# Altium footprint library Connectors.PcbLib: 79 footprints (part 1 of 5)
Each footprint in its own frame and in the unit in brackets; x right, y up, seen from the top. Pads: shape width x height; smd on the part's side, far side on the other; paste and mask are expansions set on the pad; w line width, h text height; cw(c..) or ccw(c..) is an arc to the next point about the centre after c.
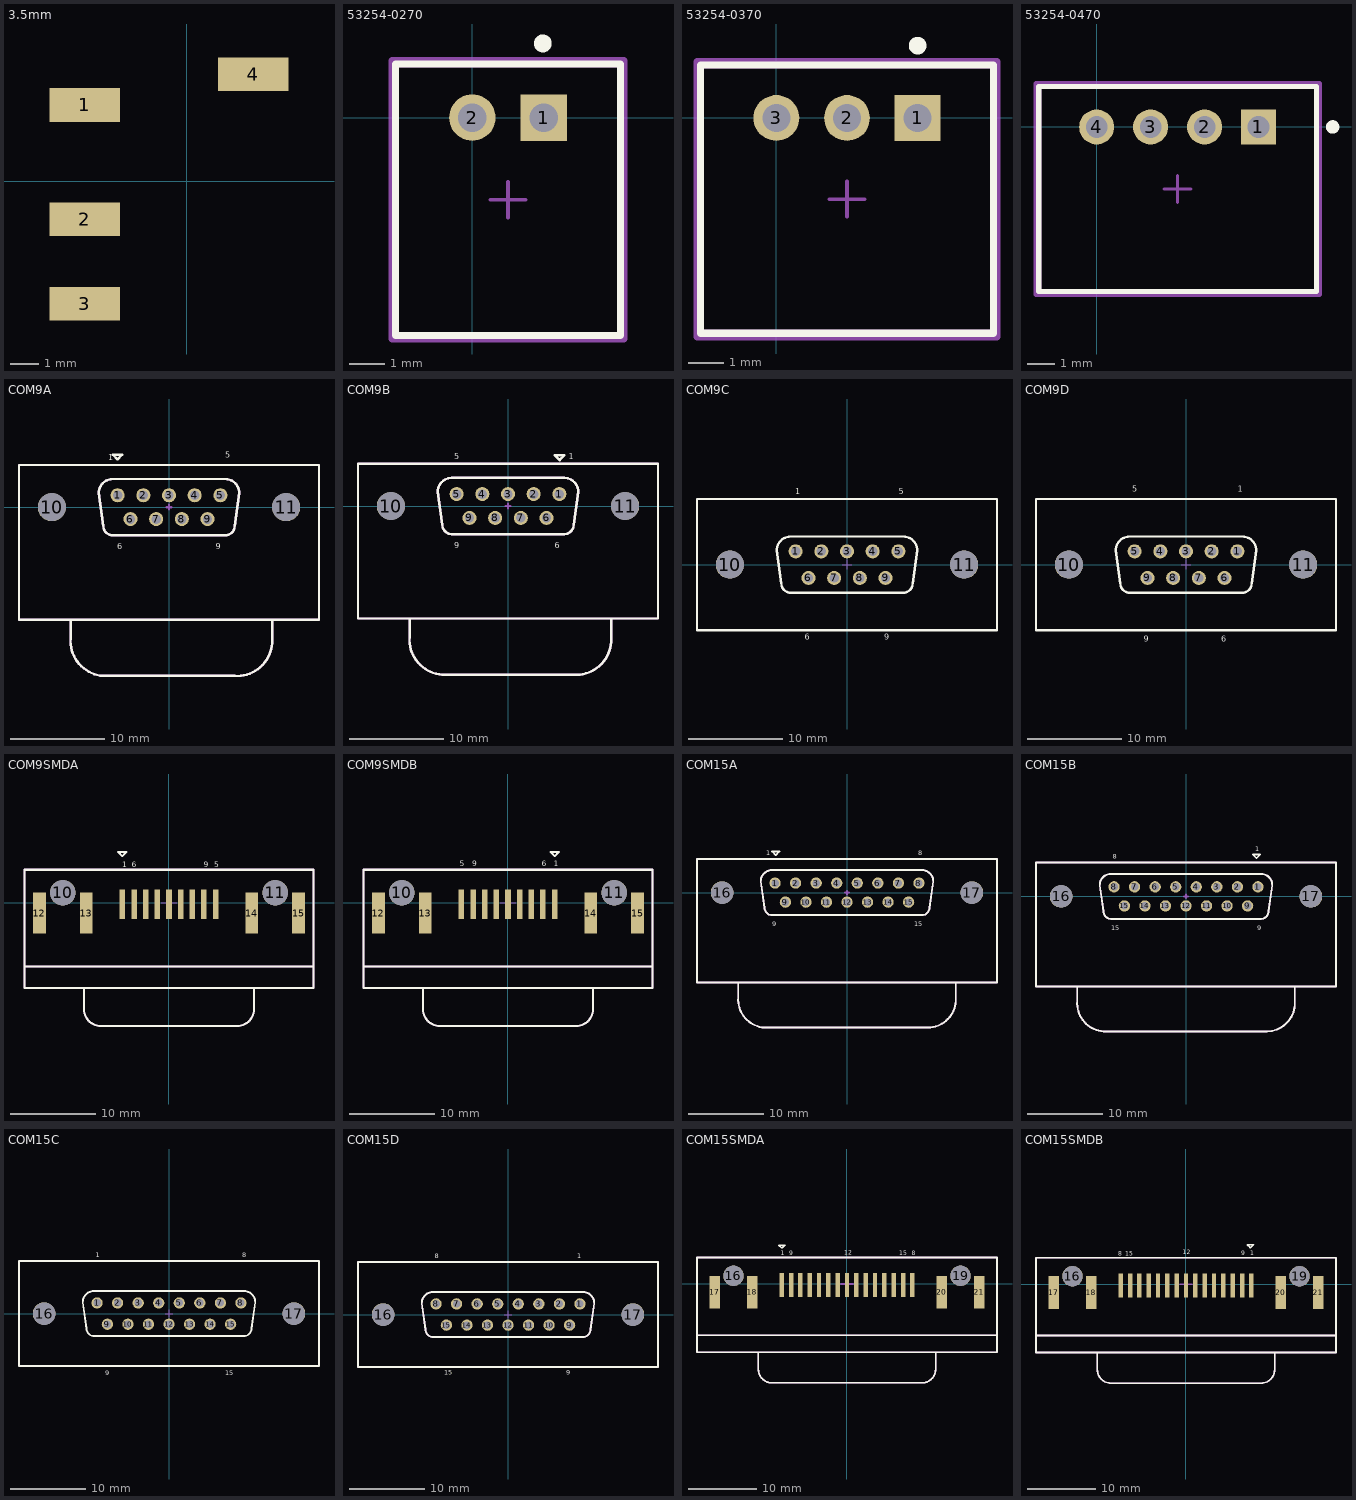
[diagram p0: the footprints below, top view; thin cyan lines are the x and y axes]

## 3.5mm [mm]
pads (4):
  rect 2.5x1.2 smd: 1(-3.627,2.71) 2(-3.627,-1.36) 3(-3.627,-4.374) 4(2.38,3.81)

## 53254-0270 [mm] "CONN HEADER R/A 2POS 2MM"
pads (2):
  rect 1.3x1.3 hole 0.8 paste-2539.97 mask+0: 1(2,0)
  round 1.3 hole 0.8 paste-2539.97 mask+0: 2(0,0)
Top Overlay:
  circle w0.25: c1.975,2.075 r0.125
  lines w0.2: -2.15,-6.1 -2.15,1.5 4.15,1.5 4.15,-6.1 -2.15,-6.1
Top Courtyard:
  lines w0.2: -2.25,-6.2 -2.25,1.6 4.25,1.6 4.25,-6.2 -2.25,-6.2
Top 3D Body:
  lines w0.2: -2.15,-6.1 -2.15,1.5 4.15,1.5 4.15,-6.1 -2.15,-6.1
Top Assembly:
  lines w0.2: -2.25,-6.2 -2.25,1.6 4.25,1.6 4.25,-6.2 -2.25,-6.2
  text ".Designator" at 1,-2.488 h1
Top Component Center:
  lines w0.1: 0.5,-2.3 1.5,-2.3 ; 1,-2.8 1,-1.8
3D body "Conn_Molex_53254-0270_eec.STEP": height 0.25, standoff 0, extent -2.25,-6.2 4.25,1.6

## 53254-0370 [mm] "CONN HEADER R/A 3POS 2MM"
pads (3):
  rect 1.3x1.3 hole 0.8 paste-2539.97 mask+0: 1(4,0)
  round 1.3 hole 0.8 paste-2539.97 mask+0: 2(2,0) 3(0,0)
Top Overlay:
  circle w0.25: c4,2.05 r0.125
  lines w0.2: -2.15,-6.1 6.15,-6.1 6.15,1.5 -2.15,1.5 -2.15,-6.1
Top Courtyard:
  lines w0.2: -2.25,-6.2 6.25,-6.2 6.25,1.6 -2.25,1.6 -2.25,-6.2
Top 3D Body:
  lines w0.2: -2.15,-6.1 6.15,-6.1 6.15,1.5 -2.15,1.5 -2.15,-6.1
Top Assembly:
  lines w0.2: -2.25,-6.2 6.25,-6.2 6.25,1.6 -2.25,1.6 -2.25,-6.2
  text ".Designator" at 2,-2.3 h1
Top Component Center:
  lines w0.1: 1.5,-2.3 2.5,-2.3 ; 2,-2.8 2,-1.8
3D body "Conn_Molex_53254-0370_eec.STEP": height 0.25, standoff 0, extent -2.25,-6.2 6.25,1.6

## 53254-0470 [mm] "CONN HEADER R/A 4POS 2MM"
pads (4):
  rect 1.3x1.3 hole 0.8 paste-2539.97 mask+0: 1(6,0)
  round 1.3 hole 0.8 paste-2539.97 mask+0: 2(4,0) 3(2,0) 4(0,0)
Top Overlay:
  circle w0.25: c8.75,0 r0.125
  lines w0.2: -2.15,-6.1 -2.15,1.5 8.15,1.5 8.15,-6.1 -2.15,-6.1
Top Courtyard:
  lines w0.2: -2.25,-6.2 -2.25,1.6 8.25,1.6 8.25,-6.2 -2.25,-6.2
Top 3D Body:
  lines w0.2: -2.15,-6.1 -2.15,1.5 8.15,1.5 8.15,-6.1 -2.15,-6.1
Top Assembly:
  lines w0.2: -2.25,-6.2 -2.25,1.6 8.25,1.6 8.25,-6.2 -2.25,-6.2
  text ".Designator" at 3,-2.112 h1
Top Component Center:
  lines w0.1: 2.5,-2.3 3.5,-2.3 ; 3,-2.8 3,-1.8
3D body "Conn_Molex_53254-0470_eec.STEP": height 0.25, standoff 0, extent -2.25,-6.2 8.25,1.6

## COM9A [mm] "D-SUB- 9P, MALE, RT ANGLE, TH"
height 12
pads (11):
  round 1.5 hole 1 unplated: 1(-5.48,1.27) 2(-2.74,1.27) 3(0,1.27) 4(2.74,1.27) 5(5.48,1.27) 6(-4.11,-1.27) 7(-1.37,-1.27) 8(1.37,-1.27) 9(4.11,-1.27)
  round 3 hole 3 unplated: 10(-12.5,0) 11(12.5,0)
Top Overlay:
  lines w0.254: -10.5,-12 -10.5,-14 ccw(c-6.75,-14.25) -7,-18 7,-18 ccw(c7.25,-14.25) 11,-14.5 11,-12 ; -5.996,-3.004 cw(c-5.996,-2) -7,-2 -7.5,1.5 cw(c-6,1.5) -6,3 6,3 cw(c6,1.5) 7.5,1.5 7,-2 cw(c5.996,-2) 5.996,-3.004 ; -5.996,-3 6,-3 ; -5.5,5.1 -6,5.6 -5,5.6 -5.5,5.1 ; -5.5,5.1 -5.5,5.1 ; -16,-12 -16,0 -16,4.5 16,4.5 16,-12 -16,-12
  text "6" at -5.5,-4.5 h0.64
  text "9" at 5,-4.5 h0.64
  text "5" at 6,5.25 h0.64
  text "1" at -6.5,5 h0.64
Mechanical 15:
  lines w0.254: -10.5,-12 -10.5,-14 ccw(c-6.75,-14.25) -7,-18 7,-18 ccw(c7.25,-14.25) 11,-14.5 11,-12 ; -5.996,-3.004 cw(c-5.996,-2) -7,-2 -7.5,1.5 cw(c-6,1.5) -6,3 6,3 cw(c6,1.5) 7.5,1.5 7,-2 cw(c5.996,-2) 5.996,-3.004 ; -5.996,-3 6,-3 ; -0.25,0 0.25,0 ; 0,-0.25 0,0.25 ; -16,-12 16,-12 16,4.5 -16,4.5 -16,0 -16,-12
3D body "210112043.stp": height 13.2, standoff -3.6, extent -15.4,-17.5 15.4,4.2

## COM9B [mm] "D-SUB- 9P, FEMALE, RT ANGLE, TH"
height 12
pads (11):
  round 1.5 hole 1 unplated: 1(5.48,1.27) 2(2.74,1.27) 3(0,1.27) 4(-2.74,1.27) 5(-5.48,1.27) 6(4.11,-1.27) 7(1.37,-1.27) 8(-1.37,-1.27) 9(-4.11,-1.27)
  round 3 hole 3 unplated: 10(-12.5,0) 11(12.5,0)
Top Overlay:
  lines w0.254: -10.5,-12 -10.5,-14 ccw(c-6.75,-14.25) -7,-18 7,-18 ccw(c7.25,-14.25) 11,-14.5 11,-12 ; -5.996,-3.004 cw(c-5.996,-2) -7,-2 -7.5,1.5 cw(c-6,1.5) -6,3 6,3 cw(c6,1.5) 7.5,1.5 7,-2 cw(c5.996,-2) 5.996,-3.004 ; -5.996,-3 6,-3 ; 5.5,4.9 5,5.4 6,5.4 5.5,4.9 ; 5.5,4.9 5.5,4.9 ; -16,-12 16,-12 16,4.5 -16,4.5 -16,0 -16,-12
  text "1" at 6.5,5 h0.64
  text "5" at -5.75,5 h0.64
  text "9" at -5.75,-4.5 h0.64
  text "6" at 5,-4.5 h0.64
Mechanical 15:
  lines w0.254: -10.5,-12 -10.5,-14 ccw(c-6.75,-14.25) -7,-18 7,-18 ccw(c7.25,-14.25) 11,-14.5 11,-12 ; -5.996,-3.004 cw(c-5.996,-2) -7,-2 -7.5,1.5 cw(c-6,1.5) -6,3 6,3 cw(c6,1.5) 7.5,1.5 7,-2 cw(c5.996,-2) 5.996,-3.004 ; -5.996,-3 6,-3 ; -0.25,0 0.25,0 ; 0,-0.25 0,0.25 ; -16,-12 -16,0 -16,4.5 16,4.5 16,-12 -16,-12
3D body "210612043.stp": height 13.2, standoff -3.6, extent -15.4,-17.65 15.4,4.2

## COM9C [mm] "D-SUB- 9P, MALE, SOLDER BUCKET VERTICAL MOUNT, TH"
height 12
pads (11):
  round 1.5 hole 1 unplated: 1(-5.48,1.42) 2(-2.74,1.42) 3(0,1.42) 4(2.74,1.42) 5(5.48,1.42) 6(-4.11,-1.42) 7(-1.37,-1.42) 8(1.37,-1.42) 9(4.11,-1.42)
  round 3 hole 3 unplated: 10(-12.5,0) 11(12.5,0)
Top Overlay:
  lines w0.254: -5.996,-3.004 cw(c-5.996,-2) -7,-2 -7.5,1.5 cw(c-6,1.5) -6,3 6,3 cw(c6,1.5) 7.5,1.5 7,-2 cw(c5.996,-2) 5.996,-3.004 ; -5.996,-3 6,-3 ; -16,-7 16,-7 16,7 -16,7 -16,0 -16,-7
  text "5" at 5.5,7.5 h0.64
  text "1" at -5.5,7.5 h0.64
  text "9" at 4,-8 h0.64
  text "6" at -4.5,-8 h0.64
Mechanical 15:
  lines w0.102: -0.5,0 0.5,0 ; 0,-0.5 0,0.5
3D body "210113003.stp": height 12.5, standoff -4.8, extent -15.4,-6.2 15.4,6.2

## COM9D [mm] "D-SUB- 9P, FEMALE, SOLDER BUCKET VERTICAL MOUNT, TH"
height 12
pads (11):
  round 1.5 hole 1 unplated: 1(5.48,1.42) 2(2.74,1.42) 3(0,1.42) 4(-2.74,1.42) 5(-5.48,1.42) 6(4.11,-1.42) 7(1.37,-1.42) 8(-1.37,-1.42) 9(-4.11,-1.42)
  round 3 hole 3 unplated: 10(-12.5,0) 11(12.5,0)
Top Overlay:
  lines w0.254: -5.996,-3.004 cw(c-5.996,-2) -7,-2 -7.5,1.5 cw(c-6,1.5) -6,3 6,3 cw(c6,1.5) 7.5,1.5 7,-2 cw(c5.996,-2) 5.996,-3.004 ; -5.996,-3 6,-3 ; -16,-7 -16,0 -16,7 16,7 16,-7 -16,-7
  text "5" at -5.75,7.75 h0.64
  text "1" at 5.5,7.75 h0.64
  text "6" at 3.75,-8.25 h0.64
  text "9" at -4.5,-8.25 h0.64
Mechanical 15:
  lines w0.102: -0.5,0 0.5,0 ; 0,-0.5 0,0.5
3D body "210613003.stp": height 12.65, standoff -4.8, extent -15.4,-6.2 15.4,6.2

## COM9SMDA [mm] "D-SUB- 9P, MALE, RT ANGLE, SMT"
height 12.4
pads (15):
  rect 0.65x3.5 smd: 1(-5.48,-0.15) 2(-2.74,-0.15) 3(0,-0.15) 4(2.74,-0.15) 5(5.48,-0.15) 6(-4.11,-0.15) 7(-1.37,-0.15) 8(1.37,-0.15) 9(4.11,-0.15)
  round 3 hole 3 unplated: 10(-12.5,1.2) 11(12.5,1.2)
  rect 1.5x4.8 smd: 12(-15.25,-1.2) 13(-9.75,-1.2) 14(9.75,-1.2) 15(15.25,-1.2)
Top Overlay:
  lines w0.254: -10,-10 -10,-12.5 ccw(c-8,-12.5) -8,-14.5 8,-14.5 ccw(c8,-12.5) 10,-12.5 10,-10 ; -17,-7.5 17,-7.5 ; -17,-7.5 -17,3.9 17,3.9 17,-7.5 ; -17,-7.5 -17,-10 17,-10 17,-7.5 ; -6,6 -5.5,5.5 -5,6 -5.5,6 -6,6
  text "6" at -4.4,4.2 h0.64
  text "9" at 4.1,4.2 h0.64
  text "5" at 5.3,4.2 h0.64
  text "1" at -5.5,4.2 h0.64
Mechanical 15:
  lines w0.102: -0.9,0 0.9,0 ; 0,-0.9 0,0.9
  lines w0.254: -10,-10 -10,-12.5 ccw(c-8,-12.5) -8,-14.5 8,-14.5 ccw(c8,-12.5) 10,-12.5 10,-10 ; -17,-7.5 17,-7.5 ; -17,-7.5 -17,3.9 17,3.9 17,-7.5 ; -17,-7.5 -17,-10 17,-10 17,-7.5
3D body "240117113.stp": height 12.7, standoff -2.8, extent -15.5,-14.3 15.5,4

## COM9SMDB [mm] "D-SUB- 9P, FEMALE, RT ANGLE, SMT"
height 12.4
pads (15):
  rect 0.65x3.5 smd: 1(5.48,-0.15) 2(2.74,-0.15) 3(0,-0.15) 4(-2.74,-0.15) 5(-5.48,-0.15) 6(4.11,-0.15) 7(1.37,-0.15) 8(-1.37,-0.15) 9(-4.11,-0.15)
  round 3 hole 3 unplated: 10(-12.5,1.2) 11(12.5,1.2)
  rect 1.5x4.8 smd: 12(-15.25,-1.2) 13(-9.75,-1.2) 14(9.75,-1.2) 15(15.25,-1.2)
Top Overlay:
  lines w0.254: -10,-10 -10,-12.5 ccw(c-8,-12.5) -8,-14.5 8,-14.5 ccw(c8,-12.5) 10,-12.5 10,-10 ; -17,-7.5 -17,-10 17,-10 17,-7.5 ; -17,-7.5 -17,3.9 17,3.9 17,-7.5 ; -17,-7.5 17,-7.5 ; 5,6 5.5,5.5 6,6 5.5,6 5,6
  text "1" at 5.4,4.3 h0.64
  text "5" at -5.7,4.3 h0.64
  text "9" at -4.2,4.3 h0.64
  text "6" at 4,4.3 h0.64
Mechanical 15:
  lines w0.102: -0.9,0 0.9,0 ; 0,-0.9 0,0.9
  lines w0.254: -10,-10 -10,-12.5 ccw(c-8,-12.5) -8,-14.5 8,-14.5 ccw(c8,-12.5) 10,-12.5 10,-10 ; -17,-7.5 -17,-10 17,-10 17,-7.5 ; -17,-7.5 -17,3.9 17,3.9 17,-7.5 ; -17,-7.5 17,-7.5
3D body "240617113.stp": height 12.7, standoff -2.8, extent -15.5,-14.45 15.5,4

## COM15A [mm] "D-SUB- 15P, MALE, RT ANGLE, TH"
height 12
pads (17):
  round 1.5 hole 1 unplated: 1(-9.59,1.27) 2(-6.85,1.27) 3(-4.11,1.27) 4(-1.37,1.27) 5(1.37,1.27) 6(4.11,1.27) 7(6.85,1.27) 8(9.59,1.27) 9(-8.22,-1.27) 10(-5.48,-1.27) 11(-2.74,-1.27) 12(0,-1.27) 13(2.74,-1.27) 14(5.48,-1.27) 15(8.22,-1.27)
  round 3 hole 3 unplated: 16(-16.65,0) 17(16.65,0)
Top Overlay:
  lines w0.254: -14.5,-12 -14.5,-14 ccw(c-10.75,-14.25) -11,-18 10.5,-18 ccw(c10.75,-14.25) 14.5,-14.5 14.5,-12 ; 9.996,-3.004 ccw(c9.996,-2) 11,-2 11.5,1.5 ccw(c10,1.5) 10,3 -10,3 ccw(c-10,1.5) -11.5,1.5 -11,-2 ccw(c-9.996,-2) -9.996,-3.004 9.996,-2.999 ; -9.5,5 -10,5.5 -9,5.5 -9.5,5 ; -9.5,5 -9.5,5 ; -20,-12 20,-12 20,4.5 -20,4.5 -20,0 -20,-12
  text "1" at -10.75,5 h0.64
  text "8" at 9.5,5 h0.64
  text "9" at -10,-4.5 h0.64
  text "15" at 9,-4.5 h0.64
Mechanical 15:
  lines w0.254: -14.5,-12 -14.5,-14 ccw(c-10.75,-14.25) -11,-18 10.5,-18 ccw(c10.75,-14.25) 14.5,-14.5 14.5,-12 ; -0.25,0 0.25,0 ; 0,-0.25 0,0.25 ; 9.996,-3.004 ccw(c9.996,-2) 11,-2 11.5,1.5 ccw(c10,1.5) 10,3 -10,3 ccw(c-10,1.5) -11.5,1.5 -11,-2 ccw(c-9.996,-2) -9.996,-3.004 9.996,-2.999 ; -20,-12 -20,0 -20,4.5 20,4.5 20,-12 -20,-12
3D body "212112043.stp": height 13.2, standoff -3.6, extent -19.6,-17.5 19.6,4.2

## COM15B [mm] "D-SUB- 15P, FEMALE, RT ANGLE, TH"
height 12
pads (17):
  round 1.5 hole 1 unplated: 1(9.59,1.27) 2(6.85,1.27) 3(4.11,1.27) 4(1.37,1.27) 5(-1.37,1.27) 6(-4.11,1.27) 7(-6.85,1.27) 8(-9.59,1.27) 9(8.22,-1.27) 10(5.48,-1.27) 11(2.74,-1.27) 12(0,-1.27) 13(-2.74,-1.27) 14(-5.48,-1.27) 15(-8.22,-1.27)
  round 3 hole 3 unplated: 16(-16.65,0) 17(16.65,0)
Top Overlay:
  lines w0.254: -14.5,-12 -14.5,-14 ccw(c-10.75,-14.25) -11,-18 10.5,-18 ccw(c10.75,-14.25) 14.5,-14.5 14.5,-12 ; 9.996,-3.004 ccw(c9.996,-2) 11,-2 11.5,1.5 ccw(c10,1.5) 10,3 -10,3 ccw(c-10,1.5) -11.5,1.5 -11,-2 ccw(c-9.996,-2) -9.996,-3.004 9.996,-2.999 ; -20,-12 -20,0 -20,4.5 20,4.5 20,-12 -20,-12 ; 8.9,5.6 9.9,5.6 9.4,5.1 8.9,5.6
  text "15" at -10,-4.5 h0.64
  text "9" at 9.5,-4.5 h0.64
  text "1" at 9.25,6 h0.64
  text "8" at -9.75,5 h0.64
Mechanical 15:
  lines w0.254: -14.5,-12 -14.5,-14 ccw(c-10.75,-14.25) -11,-18 10.5,-18 ccw(c10.75,-14.25) 14.5,-14.5 14.5,-12 ; -0.25,0 0.25,0 ; 0,-0.25 0,0.25 ; 9.996,-3.004 ccw(c9.996,-2) 11,-2 11.5,1.5 ccw(c10,1.5) 10,3 -10,3 ccw(c-10,1.5) -11.5,1.5 -11,-2 ccw(c-9.996,-2) -9.996,-3.004 9.996,-2.999 ; -20,-12 20,-12 20,4.5 -20,4.5 -20,0 -20,-12
3D body "212612043.stp": height 13.2, standoff -3.6, extent -19.6,-17.65 19.6,4.2

## COM15C [mm] "D-SUB- 15P, MALE, SOLDER BUCKET, TH"
height 12
pads (17):
  round 1.5 hole 1 unplated: 1(-9.59,1.42) 2(-6.85,1.42) 3(-4.11,1.42) 4(-1.37,1.42) 5(1.37,1.42) 6(4.11,1.42) 7(6.85,1.42) 8(9.59,1.42) 9(-8.22,-1.42) 10(-5.48,-1.42) 11(-2.74,-1.42) 12(0,-1.42) 13(2.74,-1.42) 14(5.48,-1.42) 15(8.22,-1.42)
  round 3 hole 3 unplated: 16(-16.65,0) 17(16.65,0)
Top Overlay:
  lines w0.254: 9.996,-3.004 ccw(c9.996,-2) 11,-2 11.5,1.5 ccw(c10,1.5) 10,3 -10,3 ccw(c-10,1.5) -11.5,1.5 -11,-2 ccw(c-9.996,-2) -9.996,-3.004 9.996,-2.999 ; -20,-7 20,-7 20,7 -20,7 -20,0 -20,-7
  text "1" at -9.75,7.5 h0.64
  text "8" at 9.75,7.5 h0.64
  text "15" at 7.5,-8.25 h0.64
  text "9" at -8.5,-8.25 h0.64
Mechanical 15:
  lines w0.102: -0.5,0 0.5,0 ; 0,-0.5 0,0.5
3D body "212113003.stp": height 12.5, standoff -4.8, extent -19.6,-6.2 19.6,6.2

## COM15D [mm] "D-SUB- 15P, FEMALE, SOLDER BUCKET, TH"
height 12
pads (17):
  round 1.5 hole 1 unplated: 1(9.59,1.42) 2(6.85,1.42) 3(4.11,1.42) 4(1.37,1.42) 5(-1.37,1.42) 6(-4.11,1.42) 7(-6.85,1.42) 8(-9.59,1.42) 9(8.22,-1.42) 10(5.48,-1.42) 11(2.74,-1.42) 12(0,-1.42) 13(-2.74,-1.42) 14(-5.48,-1.42) 15(-8.22,-1.42)
  round 3 hole 3 unplated: 16(-16.65,0) 17(16.65,0)
Top Overlay:
  lines w0.254: 9.996,-3.004 ccw(c9.996,-2) 11,-2 11.5,1.5 ccw(c10,1.5) 10,3 -10,3 ccw(c-10,1.5) -11.5,1.5 -11,-2 ccw(c-9.996,-2) -9.996,-3.004 9.996,-2.999 ; -20,-7 20,-7 20,7 -20,7 -20,0 -20,-7
  text "15" at -8.5,-8 h0.64
  text "8" at -9.75,7.5 h0.64
  text "1" at 9.25,7.5 h0.64
  text "9" at 7.75,-8 h0.64
Mechanical 15:
  lines w0.102: -0.5,0 0.5,0 ; 0,-0.5 0,0.5
  lines w0.254: 9.996,-3.004 ccw(c9.996,-2) 11,-2 11.5,1.5 ccw(c10,1.5) 10,3 -10,3 ccw(c-10,1.5) -11.5,1.5 -11,-2 ccw(c-9.996,-2) -9.996,-3.004 9.996,-2.999 ; -20,-7 -20,0 -20,7 20,7 20,-7 -20,-7
3D body "212613003.stp": height 12.65, standoff -4.8, extent -19.6,-6.2 19.6,6.2

## COM15SMDA [mm] "D-SUB- 15P, MALE, RT ANGLE, SMT"
height 12.4
pads (21):
  rect 0.65x3.5 smd: 1(-9.57,-0.15) 2(-6.83,-0.15) 3(-4.11,-0.15) 4(-1.37,-0.15) 5(1.37,-0.15) 6(4.11,-0.15) 7(6.85,-0.15) 8(9.59,-0.15) 9(-8.2,-0.15) 10(-5.48,-0.15) 11(-2.74,-0.15) 12(0,-0.15) 13(2.74,-0.15) 14(5.48,-0.15) 15(8.22,-0.15)
  round 3 hole 3 unplated: 16(-16.65,1.2) 19(16.65,1.2)
  rect 1.5x4.8 smd: 17(-19.4,-1.2) 18(-13.9,-1.2) 20(13.9,-1.2) 21(19.4,-1.2)
Top Overlay:
  lines w0.254: -22,-7.5 22,-7.5 ; -13,-10 -13,-12.5 ccw(c-11,-12.5) -11,-14.5 11,-14.5 ccw(c11,-12.5) 13,-12.5 13,-10 ; -10,5.7 -9.1,5.7 -9.5,5.3 -9.6,5.3 -10,5.7 ; -10,5.7 -9.9,5.7 -10,5.7 ; -10,5.7 -10,5.7 ; -22,-10 -17,-10 17,-10 22,-10 22,3.9 -22,3.9 -22,-10
  text "15" at 7.7,4.2 h0.64
  text "9" at -8.5,4.2 h0.64
  text "12" at -0.4,4.3 h0.64
  text "8" at 9.5,4.2 h0.64
  text "1" at -9.7,4.2 h0.64
Mechanical 15:
  lines w0.254: -22,-7.5 22,-7.5 ; -13,-10 -13,-12.5 ccw(c-11,-12.5) -11,-14.5 11,-14.5 ccw(c11,-12.5) 13,-12.5 13,-10 ; -0.9,0 0.9,0 ; 0,-0.9 0,0.9 ; -22,-10 -17,-10 17,-10 22,-10 22,3.9 -22,3.9 -22,-10
3D body "242117113.stp": height 12.7, standoff -2.8, extent -19.65,-14.3 19.65,4

## COM15SMDB [mm] "D-SUB- 15P, FEMALE, RT ANGLE, SMT"
height 12.4
pads (21):
  rect 0.65x3.5 smd: 1(9.59,-0.15) 2(6.85,-0.15) 3(4.11,-0.15) 4(1.37,-0.15) 5(-1.37,-0.15) 6(-4.11,-0.15) 7(-6.83,-0.15) 8(-9.57,-0.15) 9(8.22,-0.15) 10(5.48,-0.15) 11(2.74,-0.15) 12(0,-0.15) 13(-2.74,-0.15) 14(-5.48,-0.15) 15(-8.2,-0.15)
  round 3 hole 3 unplated: 16(-16.65,1.2) 19(16.65,1.2)
  rect 1.5x4.8 smd: 17(-19.4,-1.2) 18(-13.9,-1.2) 20(13.9,-1.2) 21(19.4,-1.2)
Top Overlay:
  lines w0.254: -22,-7.5 22,-7.5 ; -13,-10 -13,-12.5 ccw(c-11,-12.5) -11,-14.5 11,-14.5 ccw(c11,-12.5) 13,-12.5 13,-10 ; 9,5.8 9.9,5.8 9.5,5.4 9.4,5.4 9,5.8 ; 9,5.8 9.1,5.8 9,5.8 ; 9,5.8 9,5.8 ; -22,-10 -22,3.9 22,3.9 22,-10 17,-10 -17,-10 -22,-10
  text "1" at 9.4,4.3 h0.64
  text "8" at -9.9,4.2 h0.64
  text "12" at -0.5,4.4 h0.64
  text "9" at 8.1,4.3 h0.64
  text "15" at -8.9,4.2 h0.64
Mechanical 15:
  lines w0.254: -22,-7.5 22,-7.5 ; -13,-10 -13,-12.5 ccw(c-11,-12.5) -11,-14.5 11,-14.5 ccw(c11,-12.5) 13,-12.5 13,-10 ; -0.9,0 0.9,0 ; 0,-0.9 0,0.9 ; -22,-10 -22,3.9 22,3.9 22,-10 17,-10 -17,-10 -22,-10
3D body "242617113.stp": height 12.7, standoff -2.8, extent -19.65,-14.45 19.65,4